# Altium footprint library SG_PCB_HOLE_Connector.PcbLib: 133 footprints (part 7 of 9)
Each footprint in its own frame and in the unit in brackets; x right, y up, seen from the top. Pads: shape width x height; smd on the part's side, far side on the other; paste and mask are expansions set on the pad; w line width, h text height; cw(c..) or ccw(c..) is an arc to the next point about the centre after c.
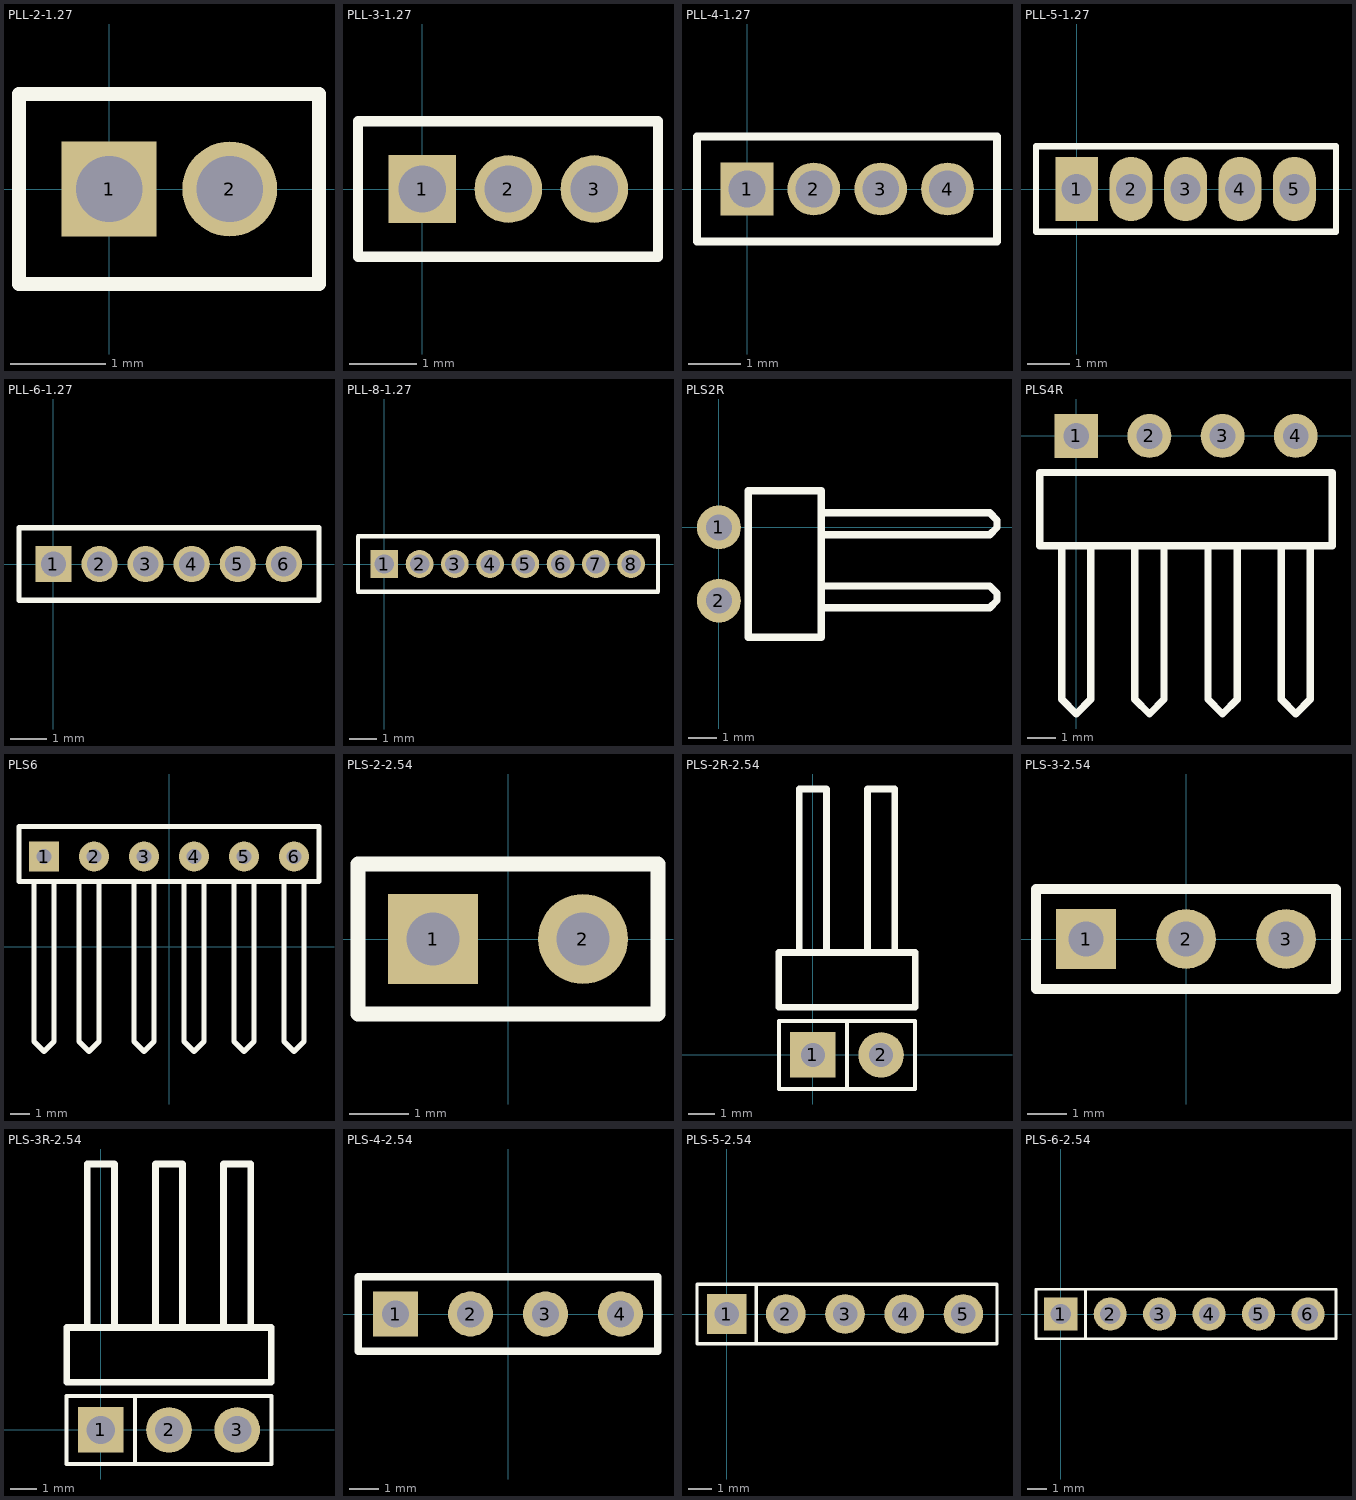
[diagram p6: the footprints below, top view; thin cyan lines are the x and y axes]

## PLL-2-1.27 [mm]
pads (2):
  rect 1x1 hole 0.7 mask+0.05: 1(0,0)
  round 1 hole 0.7 mask+0.05: 2(1.27,0)
Top Overlay:
  lines w0.15: -0.95,-1 -0.95,1 2.21,1 2.21,-1 -0.95,-1

## PLL-3-1.27 [mm]
pads (3):
  rect 1x1 hole 0.7 mask+0.05: 1(0,0)
  round 1 hole 0.7 mask+0.05: 2(1.27,0) 3(2.54,0)
Top Overlay:
  lines w0.15: -0.95,-1 3.48,-1 3.48,1 -0.95,1 -0.95,-1

## PLL-4-1.27 [mm]
pads (4):
  rect 1x1 hole 0.7 mask+0.05: 1(0,0)
  round 1 hole 0.7 mask+0.05: 2(1.27,0) 3(2.54,0) 4(3.81,0)
Top Overlay:
  lines w0.15: -0.95,-1 4.75,-1 4.75,1 -0.95,1 -0.95,-1

## PLL-5-1.27 [mm]
pads (5):
  rect 1x1.5 hole 0.7 mask+0.05: 1(0,0)
  oval 1x1.5 hole 0.7 mask+0.05: 2(1.27,0) 3(2.54,0) 4(3.81,0) 5(5.08,0)
Top Overlay:
  lines w0.15: -0.95,-1 -0.95,1 6.05,1 6.05,-1 -0.95,-1

## PLL-6-1.27 [mm]
pads (6):
  rect 1x1 hole 0.7 mask+0.05: 1(0,0)
  round 1 hole 0.7 mask+0.05: 2(1.27,0) 3(2.54,0) 4(3.81,0) 5(5.08,0) 6(6.35,0)
Top Overlay:
  lines w0.15: -0.95,-1 7.32,-1 7.32,1 -0.95,1 -0.95,-1

## PLL-8-1.27 [mm]
pads (8):
  rect 1x1 hole 0.7 mask+0.05: 1(0,0)
  round 1 hole 0.7 mask+0.05: 2(1.27,0) 3(2.54,0) 4(3.81,0) 5(5.08,0) 6(6.35,0) 7(7.62,0) 8(8.89,0)
Top Overlay:
  lines w0.15: -0.95,-1 -0.95,1 9.86,1 9.86,-1 -0.95,-1

## PLS2R [mil]
pads (2):
  round 60 hole 35.43: 1(0,0) 2(0,-100)
Top Overlay:
  lines w10: 140,-110 370,-110 380,-100 380,-90 370,-80 140,-80 ; 140,-10 370,-10 380,0 380,10 370,20 350,20 140,20 ; 40,-150 140,-150 140,50 40,50 40,-150
3D body "pls2r.stp": height 148.43, standoff -70.87, extent -19.06,-150 388.03,50

## PLS4R [mil]
pads (4):
  rect 60x60 hole 35.43: 1(0,0)
  round 60 hole 35.43: 2(100,0) 3(200,0) 4(300,0)
Top Overlay:
  lines w10: -20,-150 -20,-360 0,-380 20,-360 20,-150 ; 80,-150 80,-360 100,-380 120,-360 120,-150 ; 180,-150 180,-360 200,-380 220,-360 220,-150 ; 280,-150 280,-360 300,-380 320,-360 320,-150 ; -50,-150 350,-150 350,-50 -50,-50 -50,-150
3D body "pls2r.stp": height 168.11, standoff -51.18, extent 150,-388.03 350,19.06
3D body "pls2r.stp": height 168.11, standoff -51.18, extent -50,-388.03 150,19.06

## PLS6 [mil]
pads (6):
  rect 60x60 hole 30: 1(-250,180)
  round 60 hole 30: 2(-150,180) 3(-50,180) 4(50,180) 5(150,180) 6(250,180)
Top Overlay:
  lines w10: -270,130 -270,-190 -250,-210 -230,-190 -230,130 ; -180,130 -180,-190 -160,-210 -140,-190 -140,130 ; -70,130 -70,-190 -50,-210 -30,-190 -30,130 ; 30,130 30,-190 50,-210 70,-190 70,130 ; 130,130 130,-190 150,-210 170,-190 170,130 ; 230,130 230,-190 250,-210 270,-190 270,130 ; -300,130 -300,240 300,240 300,130 -300,130
3D body "pls2r.stp": height 168.11, standoff -51.18, extent -300,-213.54 -100,193.55
3D body "pls2r.stp": height 168.11, standoff -51.18, extent -100,-213.54 100,193.55
3D body "pls2r.stp": height 168.11, standoff -51.18, extent 100,-213.54 300,193.55

## PLS-2-2.54 [mil]
height 472.44
pads (2):
  rect 60x60 hole 35.43: 1(-50,0)
  round 60 hole 35.43: 2(50,0)
Top Overlay:
  lines w10: -100,-50 100,-50 100,50 -100,50 -100,-50
3D body "PLS1.stp": height 336.22, standoff -118.11, extent 0,-50 100,50
3D body "PLS1.stp": height 336.22, standoff -118.11, extent -100,-50 0,50

## PLS-2R-2.54 [mm]
pads (2):
  rect 1.7x1.7 hole 0.9 mask+0.05: 1(0,0)
  round 1.7 hole 0.9 mask+0.05: 2(2.54,0)
Top Overlay:
  lines w0.15: 1.27,-1.27 1.27,1.27 ; -1.27,-1.27 3.81,-1.27 3.81,1.27 -1.27,1.27 -1.27,-1.27
  lines w0.254: -0.508,3.81 -0.508,9.906 0.508,9.906 0.508,3.81 ; 2.032,3.81 2.032,9.906 3.048,9.906 3.048,3.81 ; -1.27,1.778 -1.27,3.81 3.81,3.81 3.81,1.778 -1.27,1.778
3D body "PLS-1R_D1.STEP": height 3, standoff -2.5, extent -1.27,-0.354 1.27,10.006
3D body "PLS-1R_D1.STEP": height 3, standoff -2.5, extent 1.27,-0.32 3.81,10.04

## PLS-3-2.54 [mil]
pads (3):
  rect 60x60 hole 35.43: 1(-100,0)
  round 60 hole 35.43: 2(0,0) 3(100,0)
Top Overlay:
  lines w10: -150,-50 -150,50 150,50 150,-50 -150,-50
3D body "PLS1.stp": height 336.22, standoff -118.11, extent -150,-50 -50,50
3D body "PLS1.stp": height 336.22, standoff -118.11, extent -50,-50 50,50
3D body "PLS1.stp": height 336.22, standoff -118.11, extent 50,-50 150,50

## PLS-3R-2.54 [mm]
pads (3):
  rect 1.7x1.7 hole 1.05 mask+0.05: 1(0,0)
  round 1.7 hole 1.05 mask+0.05: 2(2.54,0) 3(5.08,0)
Top Overlay:
  lines w0.15: 1.27,-1.27 1.27,1.27 ; -1.27,-1.27 -1.27,1.27 6.35,1.27 6.35,-1.27 -1.27,-1.27
  lines w0.254: -0.508,3.81 -0.508,9.906 0.508,9.906 0.508,3.81 ; 2.032,3.81 2.032,9.906 3.048,9.906 3.048,3.81 ; 4.572,3.81 4.572,9.906 5.588,9.906 5.588,3.81 ; -1.27,1.778 6.35,1.778 6.35,3.81 -1.27,3.81 -1.27,1.778
3D body "PLS-1R_D1.STEP": height 3, standoff -2.5, extent 3.81,-0.32 6.35,10.04
3D body "PLS-1R_D1.STEP": height 3, standoff -2.5, extent 1.27,-0.32 3.81,10.04
3D body "PLS-1R_D1.STEP": height 3, standoff -2.5, extent -1.27,-0.354 1.27,10.006

## PLS-4-2.54 [mil]
pads (4):
  rect 60x60 hole 35.43: 1(-150,0)
  round 60 hole 35.43: 2(-50,0) 3(50,0) 4(150,0)
Top Overlay:
  lines w10: -200,-50 200,-50 200,50 -200,50 -200,-50
3D body "PLS1.stp": height 336.22, standoff -118.11, extent 100,-50 200,50
3D body "PLS1.stp": height 336.22, standoff -118.11, extent 0,-50 100,50
3D body "PLS1.stp": height 336.22, standoff -118.11, extent -100,-50 0,50
3D body "PLS1.stp": height 336.22, standoff -118.11, extent -200,-50 -100,50

## PLS-5-2.54 [mm]
pads (5):
  rect 1.7x1.7 hole 1.05 mask+0.05: 1(0,0)
  round 1.7 hole 1.05 mask+0.05: 2(2.54,0) 3(5.08,0) 4(7.62,0) 5(10.16,0)
Top Overlay:
  lines w0.15: 1.27,-1.27 1.27,1.27 ; -1.27,-1.27 11.6,-1.27 11.6,1.27 -1.27,1.27 -1.27,-1.27
3D body "PLS1.stp": height 8.54, standoff -3, extent -1.27,-1.27 1.27,1.27
3D body "PLS1.stp": height 8.54, standoff -3, extent 1.27,-1.27 3.81,1.27
3D body "PLS1.stp": height 8.54, standoff -3, extent 3.81,-1.27 6.35,1.27
3D body "PLS1.stp": height 8.54, standoff -3, extent 6.35,-1.27 8.89,1.27
3D body "PLS1.stp": height 8.54, standoff -3, extent 8.89,-1.27 11.43,1.27

## PLS-6-2.54 [mm]
pads (6):
  rect 1.7x1.7 hole 1.05 mask+0.05: 1(0,0)
  round 1.7 hole 1.05 mask+0.05: 2(2.54,0) 3(5.08,0) 4(7.62,0) 5(10.16,0) 6(12.7,0)
Top Overlay:
  lines w0.15: 1.27,-1.27 1.27,1.27 ; -1.27,-1.27 14.14,-1.27 14.14,1.27 -1.27,1.27 -1.27,-1.27
3D body "PLS1.stp": height 8.54, standoff -3, extent 3.81,-1.27 6.35,1.27
3D body "PLS1.stp": height 8.54, standoff -3, extent 6.35,-1.27 8.89,1.27
3D body "PLS1.stp": height 8.54, standoff -3, extent 8.89,-1.27 11.43,1.27
3D body "PLS1.stp": height 8.54, standoff -3, extent 11.43,-1.27 13.97,1.27
3D body "PLS1.stp": height 8.54, standoff -3, extent -1.27,-1.27 1.27,1.27
3D body "PLS1.stp": height 8.54, standoff -3, extent 1.27,-1.27 3.81,1.27